# Altium footprint library IC_SMD_BGA.PCBLIB: 101 footprints (part 6 of 13)
Each footprint in its own frame and in the unit in brackets; x right, y up, seen from the top. Pads: shape width x height; smd on the part's side, far side on the other; paste and mask are expansions set on the pad; w line width, h text height; cw(c..) or ccw(c..) is an arc to the next point about the centre after c.
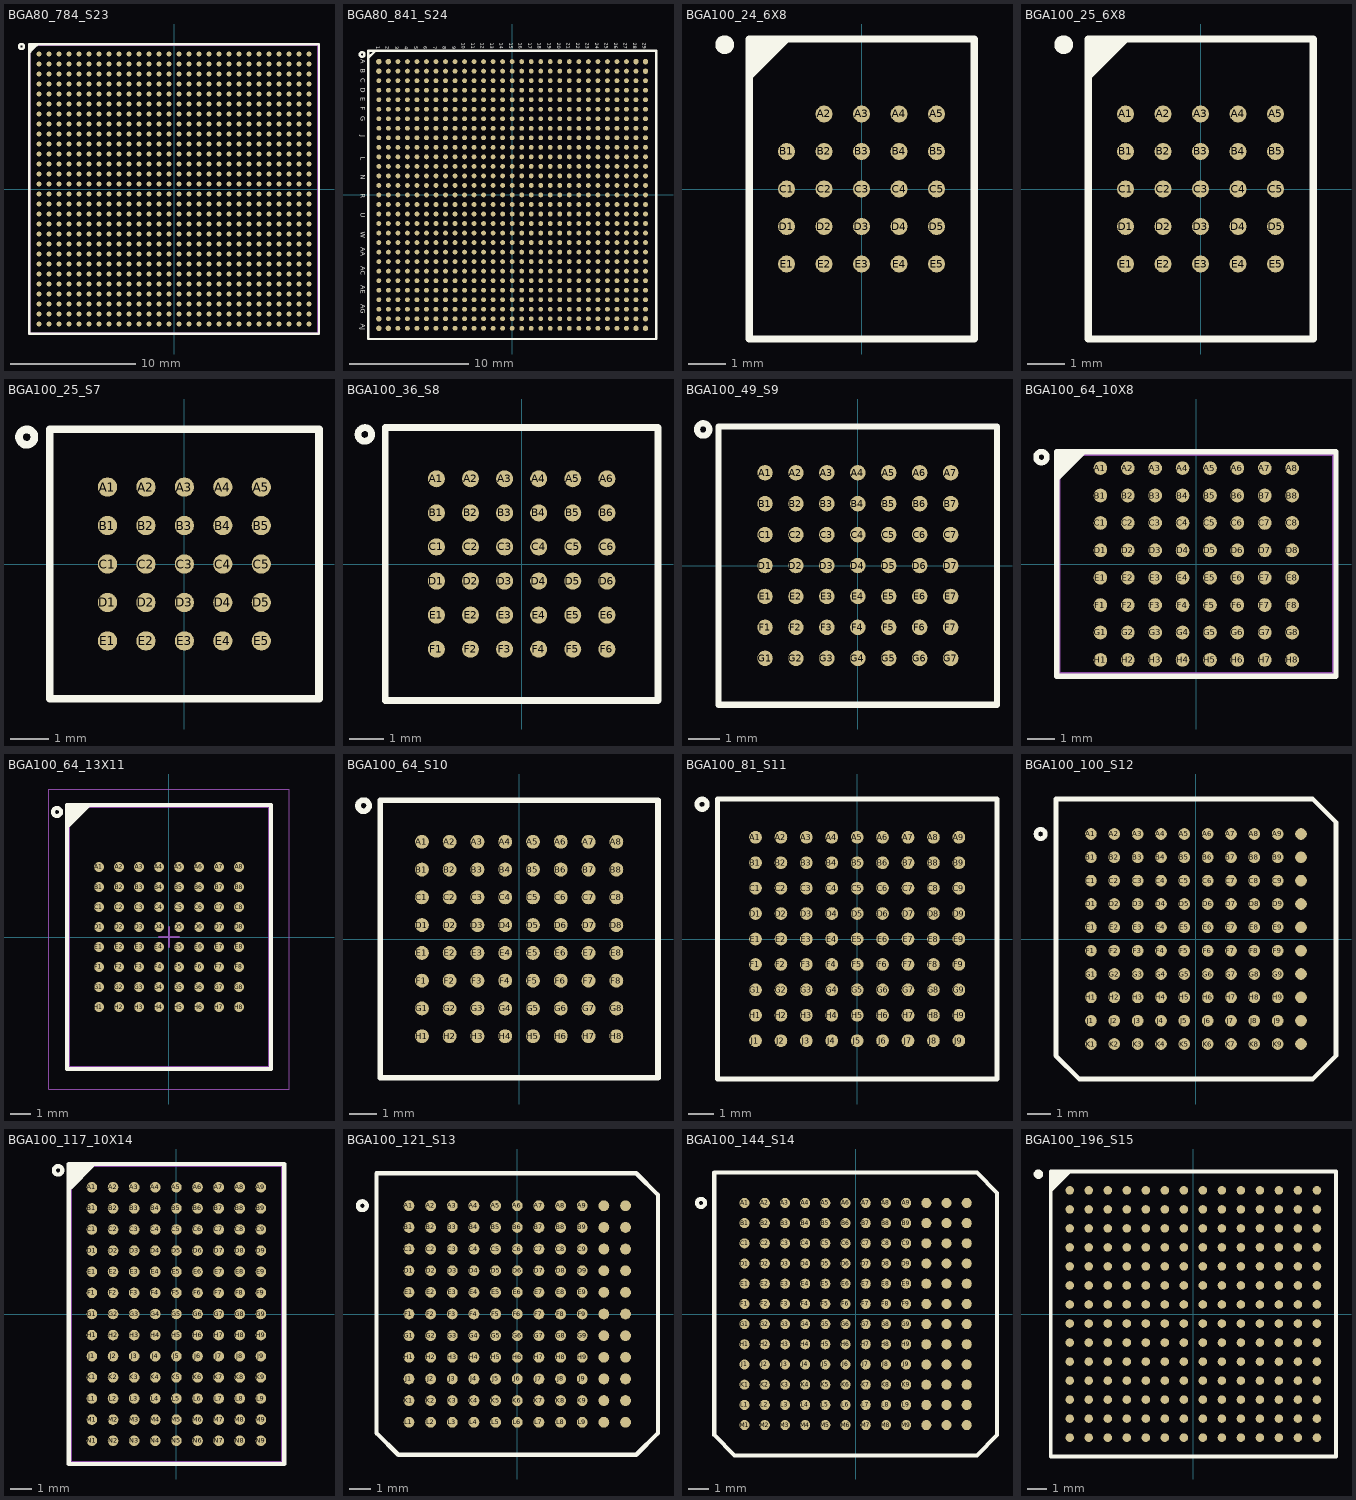
[diagram p5: the footprints below, top view; thin cyan lines are the x and y axes]

## BGA80_784_S23 [mm] "BGA, 784-Leads, SFVC784, Pitch 0.80mm, Body 23.00x23.00mmx3.30mm"
height 3.3
pads (784):
  round 0.4 smd mask+0.05: A1(-10.8,10.8) A2(-10,10.8) A3(-9.2,10.8) A4(-8.4,10.8) A5(-7.6,10.8) A6(-6.8,10.8) A7(-6,10.8) A8(-5.2,10.8) A9(-4.4,10.8) A10(-3.6,10.8) A11(-2.8,10.8) A12(-2,10.8) A13(-1.2,10.8) A14(-0.4,10.8) A15(0.4,10.8) A16(1.2,10.8) A17(2,10.8) A18(2.8,10.8) A19(3.6,10.8) A20(4.4,10.8) A21(5.2,10.8) A22(6,10.8) A23(6.8,10.8) A24(7.6,10.8) A25(8.4,10.8) A26(9.2,10.8) A27(10,10.8) A28(10.8,10.8) AA1(-10.8,-5.2) AA2(-10,-5.2) AA3(-9.2,-5.2) AA4(-8.4,-5.2) AA5(-7.6,-5.2) AA6(-6.8,-5.2) AA7(-6,-5.2) AA8(-5.2,-5.2) AA9(-4.4,-5.2) AA10(-3.6,-5.2) AA11(-2.8,-5.2) AA12(-2,-5.2) AA13(-1.2,-5.2) AA14(-0.4,-5.2) AA15(0.4,-5.2) AA16(1.2,-5.2) AA17(2,-5.2) AA18(2.8,-5.2) AA19(3.6,-5.2) AA20(4.4,-5.2) AA21(5.2,-5.2) AA22(6,-5.2) AA23(6.8,-5.2) AA24(7.6,-5.2) AA25(8.4,-5.2) AA26(9.2,-5.2) AA27(10,-5.2) AA28(10.8,-5.2) AB1(-10.8,-6) AB2(-10,-6) AB3(-9.2,-6) AB4(-8.4,-6) AB5(-7.6,-6) AB6(-6.8,-6) AB7(-6,-6) AB8(-5.2,-6) AB9(-4.4,-6) AB10(-3.6,-6) AB11(-2.8,-6) AB12(-2,-6) AB13(-1.2,-6) AB14(-0.4,-6) AB15(0.4,-6) AB16(1.2,-6) AB17(2,-6) AB18(2.8,-6) AB19(3.6,-6) AB20(4.4,-6) AB21(5.2,-6) AB22(6,-6) AB23(6.8,-6) AB24(7.6,-6) AB25(8.4,-6) AB26(9.2,-6) AB27(10,-6) AB28(10.8,-6) AC1(-10.8,-6.8) AC2(-10,-6.8) AC3(-9.2,-6.8) AC4(-8.4,-6.8) AC5(-7.6,-6.8) AC6(-6.8,-6.8) AC7(-6,-6.8) AC8(-5.2,-6.8) AC9(-4.4,-6.8) AC10(-3.6,-6.8) AC11(-2.8,-6.8) AC12(-2,-6.8) AC13(-1.2,-6.8) AC14(-0.4,-6.8) AC15(0.4,-6.8) AC16(1.2,-6.8) AC17(2,-6.8) AC18(2.8,-6.8) AC19(3.6,-6.8) AC20(4.4,-6.8) AC21(5.2,-6.8) AC22(6,-6.8) AC23(6.8,-6.8) AC24(7.6,-6.8) AC25(8.4,-6.8) AC26(9.2,-6.8) AC27(10,-6.8) AC28(10.8,-6.8) AD1(-10.8,-7.6) AD2(-10,-7.6) AD3(-9.2,-7.6) AD4(-8.4,-7.6) AD5(-7.6,-7.6) AD6(-6.8,-7.6) AD7(-6,-7.6) AD8(-5.2,-7.6) AD9(-4.4,-7.6) AD10(-3.6,-7.6) AD11(-2.8,-7.6) AD12(-2,-7.6) AD13(-1.2,-7.6) AD14(-0.4,-7.6) AD15(0.4,-7.6) AD16(1.2,-7.6) AD17(2,-7.6) AD18(2.8,-7.6) AD19(3.6,-7.6) AD20(4.4,-7.6) AD21(5.2,-7.6) AD22(6,-7.6) AD23(6.8,-7.6) AD24(7.6,-7.6) AD25(8.4,-7.6) AD26(9.2,-7.6) AD27(10,-7.6) AD28(10.8,-7.6) AE1(-10.8,-8.4) AE2(-10,-8.4) AE3(-9.2,-8.4) AE4(-8.4,-8.4) AE5(-7.6,-8.4) AE6(-6.8,-8.4) AE7(-6,-8.4) AE8(-5.2,-8.4) AE9(-4.4,-8.4) AE10(-3.6,-8.4) AE11(-2.8,-8.4) AE12(-2,-8.4) AE13(-1.2,-8.4) AE14(-0.4,-8.4) AE15(0.4,-8.4) AE16(1.2,-8.4) AE17(2,-8.4) AE18(2.8,-8.4) AE19(3.6,-8.4) AE20(4.4,-8.4) AE21(5.2,-8.4) AE22(6,-8.4) AE23(6.8,-8.4) AE24(7.6,-8.4) AE25(8.4,-8.4) AE26(9.2,-8.4) AE27(10,-8.4) AE28(10.8,-8.4) AF1(-10.8,-9.2) AF2(-10,-9.2) AF3(-9.2,-9.2) AF4(-8.4,-9.2) AF5(-7.6,-9.2) AF6(-6.8,-9.2) AF7(-6,-9.2) AF8(-5.2,-9.2) AF9(-4.4,-9.2) AF10(-3.6,-9.2) AF11(-2.8,-9.2) AF12(-2,-9.2) AF13(-1.2,-9.2) AF14(-0.4,-9.2) AF15(0.4,-9.2) AF16(1.2,-9.2) AF17(2,-9.2) AF18(2.8,-9.2) AF19(3.6,-9.2) AF20(4.4,-9.2) AF21(5.2,-9.2) AF22(6,-9.2) AF23(6.8,-9.2) AF24(7.6,-9.2) AF25(8.4,-9.2) AF26(9.2,-9.2) AF27(10,-9.2) AF28(10.8,-9.2) AG1(-10.8,-10) AG2(-10,-10) AG3(-9.2,-10) AG4(-8.4,-10) AG5(-7.6,-10) AG6(-6.8,-10) AG7(-6,-10) AG8(-5.2,-10) AG9(-4.4,-10) AG10(-3.6,-10) AG11(-2.8,-10) AG12(-2,-10) AG13(-1.2,-10) AG14(-0.4,-10) AG15(0.4,-10) AG16(1.2,-10) AG17(2,-10) AG18(2.8,-10) AG19(3.6,-10) AG20(4.4,-10) AG21(5.2,-10) AG22(6,-10) AG23(6.8,-10) AG24(7.6,-10) AG25(8.4,-10) AG26(9.2,-10) AG27(10,-10) AG28(10.8,-10) AH1(-10.8,-10.8) AH2(-10,-10.8) AH3(-9.2,-10.8) AH4(-8.4,-10.8) AH5(-7.6,-10.8) AH6(-6.8,-10.8) AH7(-6,-10.8) AH8(-5.2,-10.8) AH9(-4.4,-10.8) AH10(-3.6,-10.8) AH11(-2.8,-10.8) AH12(-2,-10.8) AH13(-1.2,-10.8) AH14(-0.4,-10.8) AH15(0.4,-10.8) AH16(1.2,-10.8) AH17(2,-10.8) AH18(2.8,-10.8) AH19(3.6,-10.8) AH20(4.4,-10.8) AH21(5.2,-10.8) AH22(6,-10.8) AH23(6.8,-10.8) AH24(7.6,-10.8) AH25(8.4,-10.8) AH26(9.2,-10.8) AH27(10,-10.8) AH28(10.8,-10.8) B1(-10.8,10) B2(-10,10) B3(-9.2,10) B4(-8.4,10) B5(-7.6,10) B6(-6.8,10) B7(-6,10) B8(-5.2,10) B9(-4.4,10) B10(-3.6,10) B11(-2.8,10) B12(-2,10) B13(-1.2,10) B14(-0.4,10) B15(0.4,10) B16(1.2,10) B17(2,10) B18(2.8,10) B19(3.6,10) B20(4.4,10) B21(5.2,10) B22(6,10) B23(6.8,10) B24(7.6,10) B25(8.4,10) B26(9.2,10) B27(10,10) B28(10.8,10) C1(-10.8,9.2) C2(-10,9.2) C3(-9.2,9.2) C4(-8.4,9.2) C5(-7.6,9.2) C6(-6.8,9.2) C7(-6,9.2) C8(-5.2,9.2) C9(-4.4,9.2) C10(-3.6,9.2) C11(-2.8,9.2) C12(-2,9.2) C13(-1.2,9.2) C14(-0.4,9.2) C15(0.4,9.2) C16(1.2,9.2) C17(2,9.2) C18(2.8,9.2) C19(3.6,9.2) C20(4.4,9.2) C21(5.2,9.2) C22(6,9.2) C23(6.8,9.2) C24(7.6,9.2) C25(8.4,9.2) C26(9.2,9.2) C27(10,9.2) C28(10.8,9.2) D1(-10.8,8.4) D2(-10,8.4) D3(-9.2,8.4) D4(-8.4,8.4) D5(-7.6,8.4) D6(-6.8,8.4) D7(-6,8.4) D8(-5.2,8.4) D9(-4.4,8.4) D10(-3.6,8.4) D11(-2.8,8.4) D12(-2,8.4) D13(-1.2,8.4) D14(-0.4,8.4) D15(0.4,8.4) D16(1.2,8.4) D17(2,8.4) D18(2.8,8.4) D19(3.6,8.4) D20(4.4,8.4) D21(5.2,8.4) D22(6,8.4) D23(6.8,8.4) D24(7.6,8.4) D25(8.4,8.4) D26(9.2,8.4) D27(10,8.4) D28(10.8,8.4) E1(-10.8,7.6) E2(-10,7.6) E3(-9.2,7.6) E4(-8.4,7.6) E5(-7.6,7.6) E6(-6.8,7.6) E7(-6,7.6) E8(-5.2,7.6) E9(-4.4,7.6) E10(-3.6,7.6) E11(-2.8,7.6) E12(-2,7.6) E13(-1.2,7.6) E14(-0.4,7.6) E15(0.4,7.6) E16(1.2,7.6) E17(2,7.6) E18(2.8,7.6) E19(3.6,7.6) E20(4.4,7.6) E21(5.2,7.6) E22(6,7.6) E23(6.8,7.6) E24(7.6,7.6) E25(8.4,7.6) E26(9.2,7.6) E27(10,7.6) E28(10.8,7.6) F1(-10.8,6.8) F2(-10,6.8) F3(-9.2,6.8) F4(-8.4,6.8) F5(-7.6,6.8) F6(-6.8,6.8) F7(-6,6.8) F8(-5.2,6.8) F9(-4.4,6.8) F10(-3.6,6.8) F11(-2.8,6.8) F12(-2,6.8) F13(-1.2,6.8) F14(-0.4,6.8) F15(0.4,6.8) F16(1.2,6.8) F17(2,6.8) F18(2.8,6.8) F19(3.6,6.8) F20(4.4,6.8) F21(5.2,6.8) F22(6,6.8) F23(6.8,6.8) F24(7.6,6.8) F25(8.4,6.8) F26(9.2,6.8) F27(10,6.8) F28(10.8,6.8) G1(-10.8,6) G2(-10,6) G3(-9.2,6) G4(-8.4,6) G5(-7.6,6) G6(-6.8,6) G7(-6,6) G8(-5.2,6) G9(-4.4,6) G10(-3.6,6) G11(-2.8,6) G12(-2,6) G13(-1.2,6) G14(-0.4,6) G15(0.4,6) G16(1.2,6) G17(2,6) G18(2.8,6) G19(3.6,6) G20(4.4,6) G21(5.2,6) G22(6,6) G23(6.8,6) G24(7.6,6) G25(8.4,6) G26(9.2,6) G27(10,6) G28(10.8,6) H1(-10.8,5.2) H2(-10,5.2) H3(-9.2,5.2) H4(-8.4,5.2) H5(-7.6,5.2) H6(-6.8,5.2) H7(-6,5.2) H8(-5.2,5.2) H9(-4.4,5.2) H10(-3.6,5.2) H11(-2.8,5.2) H12(-2,5.2) H13(-1.2,5.2) H14(-0.4,5.2) H15(0.4,5.2) H16(1.2,5.2) H17(2,5.2) H18(2.8,5.2) H19(3.6,5.2) H20(4.4,5.2) H21(5.2,5.2) H22(6,5.2) H23(6.8,5.2) H24(7.6,5.2) H25(8.4,5.2) H26(9.2,5.2) H27(10,5.2) H28(10.8,5.2) J1(-10.8,4.4) J2(-10,4.4) J3(-9.2,4.4) J4(-8.4,4.4) J5(-7.6,4.4) J6(-6.8,4.4) J7(-6,4.4) J8(-5.2,4.4) J9(-4.4,4.4) J10(-3.6,4.4) J11(-2.8,4.4) J12(-2,4.4) J13(-1.2,4.4) J14(-0.4,4.4) J15(0.4,4.4) J16(1.2,4.4) J17(2,4.4) J18(2.8,4.4) J19(3.6,4.4) J20(4.4,4.4) J21(5.2,4.4) J22(6,4.4) J23(6.8,4.4) J24(7.6,4.4) J25(8.4,4.4) J26(9.2,4.4) J27(10,4.4) J28(10.8,4.4) K1(-10.8,3.6) K2(-10,3.6) K3(-9.2,3.6) K4(-8.4,3.6) K5(-7.6,3.6) K6(-6.8,3.6) K7(-6,3.6) K8(-5.2,3.6) K9(-4.4,3.6) K10(-3.6,3.6) K11(-2.8,3.6) K12(-2,3.6) K13(-1.2,3.6) K14(-0.4,3.6) K15(0.4,3.6) K16(1.2,3.6) K17(2,3.6) K18(2.8,3.6) K19(3.6,3.6) K20(4.4,3.6) K21(5.2,3.6) K22(6,3.6) K23(6.8,3.6) K24(7.6,3.6) K25(8.4,3.6) K26(9.2,3.6) K27(10,3.6) K28(10.8,3.6) L1(-10.8,2.8) L2(-10,2.8) L3(-9.2,2.8) L4(-8.4,2.8) L5(-7.6,2.8) L6(-6.8,2.8) L7(-6,2.8) L8(-5.2,2.8) L9(-4.4,2.8) L10(-3.6,2.8) L11(-2.8,2.8) L12(-2,2.8) L13(-1.2,2.8) L14(-0.4,2.8) L15(0.4,2.8) L16(1.2,2.8) L17(2,2.8) L18(2.8,2.8) L19(3.6,2.8) L20(4.4,2.8) L21(5.2,2.8) L22(6,2.8) L23(6.8,2.8) L24(7.6,2.8) L25(8.4,2.8) L26(9.2,2.8) L27(10,2.8) L28(10.8,2.8) M1(-10.8,2) M2(-10,2) M3(-9.2,2) M4(-8.4,2) M5(-7.6,2) M6(-6.8,2) M7(-6,2) M8(-5.2,2) M9(-4.4,2) M10(-3.6,2) M11(-2.8,2) M12(-2,2) M13(-1.2,2) M14(-0.4,2) M15(0.4,2) M16(1.2,2) M17(2,2) M18(2.8,2) M19(3.6,2) M20(4.4,2) M21(5.2,2) M22(6,2) M23(6.8,2) M24(7.6,2) M25(8.4,2) M26(9.2,2) M27(10,2) M28(10.8,2) N1(-10.8,1.2) N2(-10,1.2) N3(-9.2,1.2) N4(-8.4,1.2) N5(-7.6,1.2) N6(-6.8,1.2) N7(-6,1.2) N8(-5.2,1.2) N9(-4.4,1.2) N10(-3.6,1.2) N11(-2.8,1.2) N12(-2,1.2) N13(-1.2,1.2) N14(-0.4,1.2) N15(0.4,1.2) N16(1.2,1.2) N17(2,1.2) N18(2.8,1.2) N19(3.6,1.2) N20(4.4,1.2) N21(5.2,1.2) N22(6,1.2) N23(6.8,1.2) N24(7.6,1.2) N25(8.4,1.2) N26(9.2,1.2) N27(10,1.2) N28(10.8,1.2) P1(-10.8,0.4) P2(-10,0.4) P3(-9.2,0.4) P4(-8.4,0.4) P5(-7.6,0.4) P6(-6.8,0.4) P7(-6,0.4) P8(-5.2,0.4) P9(-4.4,0.4) P10(-3.6,0.4) P11(-2.8,0.4) P12(-2,0.4) P13(-1.2,0.4) P14(-0.4,0.4) P15(0.4,0.4) P16(1.2,0.4) P17(2,0.4) P18(2.8,0.4) P19(3.6,0.4) P20(4.4,0.4) P21(5.2,0.4) P22(6,0.4) P23(6.8,0.4) P24(7.6,0.4) P25(8.4,0.4) P26(9.2,0.4) P27(10,0.4) P28(10.8,0.4) R1(-10.8,-0.4) R2(-10,-0.4) R3(-9.2,-0.4) R4(-8.4,-0.4) R5(-7.6,-0.4) R6(-6.8,-0.4) R7(-6,-0.4) R8(-5.2,-0.4) R9(-4.4,-0.4) R10(-3.6,-0.4) R11(-2.8,-0.4) R12(-2,-0.4) R13(-1.2,-0.4) R14(-0.4,-0.4) R15(0.4,-0.4) R16(1.2,-0.4) R17(2,-0.4) R18(2.8,-0.4) R19(3.6,-0.4) R20(4.4,-0.4) R21(5.2,-0.4) R22(6,-0.4) R23(6.8,-0.4) R24(7.6,-0.4) R25(8.4,-0.4) R26(9.2,-0.4) R27(10,-0.4) R28(10.8,-0.4) T1(-10.8,-1.2) T2(-10,-1.2) T3(-9.2,-1.2) T4(-8.4,-1.2) T5(-7.6,-1.2) T6(-6.8,-1.2) T7(-6,-1.2) T8(-5.2,-1.2) T9(-4.4,-1.2) T10(-3.6,-1.2) T11(-2.8,-1.2) T12(-2,-1.2) T13(-1.2,-1.2) T14(-0.4,-1.2) T15(0.4,-1.2) T16(1.2,-1.2) T17(2,-1.2) T18(2.8,-1.2) T19(3.6,-1.2) T20(4.4,-1.2) T21(5.2,-1.2) T22(6,-1.2) T23(6.8,-1.2) T24(7.6,-1.2) T25(8.4,-1.2) T26(9.2,-1.2) T27(10,-1.2) T28(10.8,-1.2) U1(-10.8,-2) U2(-10,-2) U3(-9.2,-2) U4(-8.4,-2) U5(-7.6,-2) U6(-6.8,-2) U7(-6,-2) U8(-5.2,-2) U9(-4.4,-2) U10(-3.6,-2) U11(-2.8,-2) U12(-2,-2) U13(-1.2,-2) U14(-0.4,-2) U15(0.4,-2) U16(1.2,-2) U17(2,-2) U18(2.8,-2) U19(3.6,-2) U20(4.4,-2) U21(5.2,-2) U22(6,-2) U23(6.8,-2) U24(7.6,-2) U25(8.4,-2) U26(9.2,-2) U27(10,-2) U28(10.8,-2) V1(-10.8,-2.8) V2(-10,-2.8) V3(-9.2,-2.8) V4(-8.4,-2.8) V5(-7.6,-2.8) V6(-6.8,-2.8) V7(-6,-2.8) V8(-5.2,-2.8) V9(-4.4,-2.8) V10(-3.6,-2.8) V11(-2.8,-2.8) V12(-2,-2.8) V13(-1.2,-2.8) V14(-0.4,-2.8) V15(0.4,-2.8) V16(1.2,-2.8) V17(2,-2.8) V18(2.8,-2.8) V19(3.6,-2.8) V20(4.4,-2.8) V21(5.2,-2.8) V22(6,-2.8) V23(6.8,-2.8) V24(7.6,-2.8) V25(8.4,-2.8) V26(9.2,-2.8) V27(10,-2.8) V28(10.8,-2.8) W1(-10.8,-3.6) W2(-10,-3.6) W3(-9.2,-3.6) W4(-8.4,-3.6) W5(-7.6,-3.6) W6(-6.8,-3.6) W7(-6,-3.6) W8(-5.2,-3.6) W9(-4.4,-3.6) W10(-3.6,-3.6) W11(-2.8,-3.6) W12(-2,-3.6) W13(-1.2,-3.6) W14(-0.4,-3.6) W15(0.4,-3.6) W16(1.2,-3.6) W17(2,-3.6) W18(2.8,-3.6) W19(3.6,-3.6) W20(4.4,-3.6) W21(5.2,-3.6) W22(6,-3.6) W23(6.8,-3.6) W24(7.6,-3.6) W25(8.4,-3.6) W26(9.2,-3.6) W27(10,-3.6) W28(10.8,-3.6) Y1(-10.8,-4.4) Y2(-10,-4.4) Y3(-9.2,-4.4) Y4(-8.4,-4.4) Y5(-7.6,-4.4) Y6(-6.8,-4.4) Y7(-6,-4.4) Y8(-5.2,-4.4) Y9(-4.4,-4.4) Y10(-3.6,-4.4) Y11(-2.8,-4.4) Y12(-2,-4.4) Y13(-1.2,-4.4) Y14(-0.4,-4.4) Y15(0.4,-4.4) Y16(1.2,-4.4) Y17(2,-4.4) Y18(2.8,-4.4) Y19(3.6,-4.4) Y20(4.4,-4.4) Y21(5.2,-4.4) Y22(6,-4.4) Y23(6.8,-4.4) Y24(7.6,-4.4) Y25(8.4,-4.4) Y26(9.2,-4.4) Y27(10,-4.4) Y28(10.8,-4.4)
TopOverlay:
  circle w0.2: c-12.2,11.4 r0.2
  region: -10.984,11.5 -11.5,10.984 -11.5,11.5
  lines w0.2: -11.5,10.984 -10.984,11.5 ; -11.6,-11.6 11.6,-11.6 11.6,11.6 -11.6,11.6 -11.6,-11.6
Mechanical13:
  lines w0.1: -11.5,-11.5 11.5,-11.5 11.5,11.5 -11.5,11.5 -11.5,-11.5
3D body "BGA80_784_23X23.step": height 3.3, standoff 0, extent -11.5,-11.5 11.5,11.5

## BGA80_841_S24 [mil] "BGA_841P_31_945X945"
pads (841):
  round 18 smd: A1(-440.94,440.94) A2(-409.45,440.94) A28(409.45,440.94) A29(440.94,440.94) AH1(-440.94,-409.45) AH29(440.94,-409.45) AJ1(-440.94,-440.94) AJ2(-409.45,-440.94) AJ28(409.45,-440.94) AJ29(440.94,-440.94) B1(-440.94,409.45) B29(440.94,409.45)
  round 16 smd: A3(-377.95,440.94) A4(-346.46,440.94) A5(-314.96,440.94) A6(-283.46,440.94) A7(-251.97,440.94) A8(-220.47,440.94) A9(-188.98,440.94) A10(-157.48,440.94) A11(-125.98,440.94) A12(-94.49,440.94) A13(-62.99,440.94) A14(-31.5,440.94) A15(0,440.94) A16(31.5,440.94) A17(62.99,440.94) A18(94.49,440.94) A19(125.98,440.94) A20(157.48,440.94) A21(188.98,440.94) A22(220.47,440.94) A23(251.97,440.94) A24(283.46,440.94) A25(314.96,440.94) A26(346.46,440.94) A27(377.95,440.94) AA1(-440.94,-188.98) AA2(-409.45,-188.98) AA3(-377.95,-188.98) AA4(-346.46,-188.98) AA5(-314.96,-188.98) AA6(-283.46,-188.98) AA7(-251.97,-188.98) AA8(-220.47,-188.98) AA9(-188.98,-188.98) AA10(-157.48,-188.98) AA11(-125.98,-188.98) AA12(-94.49,-188.98) AA13(-62.99,-188.98) AA14(-31.5,-188.98) AA15(0,-188.98) AA16(31.5,-188.98) AA17(62.99,-188.98) AA18(94.49,-188.98) AA19(125.98,-188.98) AA20(157.48,-188.98) AA21(188.98,-188.98) AA22(220.47,-188.98) AA23(251.97,-188.98) AA24(283.46,-188.98) AA25(314.96,-188.98) AA26(346.46,-188.98) AA27(377.95,-188.98) AA28(409.45,-188.98) AA29(440.94,-188.98) AB1(-440.94,-220.47) AB2(-409.45,-220.47) AB3(-377.95,-220.47) AB4(-346.46,-220.47) AB5(-314.96,-220.47) AB6(-283.46,-220.47) AB7(-251.97,-220.47) AB8(-220.47,-220.47) AB9(-188.98,-220.47) AB10(-157.48,-220.47) AB11(-125.98,-220.47) AB12(-94.49,-220.47) AB13(-62.99,-220.47) AB14(-31.5,-220.47) AB15(0,-220.47) AB16(31.5,-220.47) AB17(62.99,-220.47) AB18(94.49,-220.47) AB19(125.98,-220.47) AB20(157.48,-220.47) AB21(188.98,-220.47) AB22(220.47,-220.47) AB23(251.97,-220.47) AB24(283.46,-220.47) AB25(314.96,-220.47) AB26(346.46,-220.47) AB27(377.95,-220.47) AB28(409.45,-220.47) AB29(440.94,-220.47) AC1(-440.94,-251.97) AC2(-409.45,-251.97) AC3(-377.95,-251.97) AC4(-346.46,-251.97) AC5(-314.96,-251.97) AC6(-283.46,-251.97) AC7(-251.97,-251.97) AC8(-220.47,-251.97) AC9(-188.98,-251.97) AC10(-157.48,-251.97) AC11(-125.98,-251.97) AC12(-94.49,-251.97) AC13(-62.99,-251.97) AC14(-31.5,-251.97) AC15(0,-251.97) AC16(31.5,-251.97) AC17(62.99,-251.97) AC18(94.49,-251.97) AC19(125.98,-251.97) AC20(157.48,-251.97) AC21(188.98,-251.97) AC22(220.47,-251.97) AC23(251.97,-251.97) AC24(283.46,-251.97) AC25(314.96,-251.97) AC26(346.46,-251.97) AC27(377.95,-251.97) AC28(409.45,-251.97) AC29(440.94,-251.97) AD1(-440.94,-283.46) AD2(-409.45,-283.46) AD3(-377.95,-283.46) AD4(-346.46,-283.46) AD5(-314.96,-283.46) AD6(-283.46,-283.46) AD7(-251.97,-283.46) AD8(-220.47,-283.46) AD9(-188.98,-283.46) AD10(-157.48,-283.46) AD11(-125.98,-283.46) AD12(-94.49,-283.46) AD13(-62.99,-283.46) AD14(-31.5,-283.46) AD15(0,-283.46) AD16(31.5,-283.46) AD17(62.99,-283.46) AD18(94.49,-283.46) AD19(125.98,-283.46) AD20(157.48,-283.46) AD21(188.98,-283.46) AD22(220.47,-283.46) AD23(251.97,-283.46) AD24(283.46,-283.46) AD25(314.96,-283.46) AD26(346.46,-283.46) AD27(377.95,-283.46) AD28(409.45,-283.46) AD29(440.94,-283.46) AE1(-440.94,-314.96) AE2(-409.45,-314.96) AE3(-377.95,-314.96) AE4(-346.46,-314.96) AE5(-314.96,-314.96) AE6(-283.46,-314.96) AE7(-251.97,-314.96) AE8(-220.47,-314.96) AE9(-188.98,-314.96) AE10(-157.48,-314.96) AE11(-125.98,-314.96) AE12(-94.49,-314.96) AE13(-62.99,-314.96) AE14(-31.5,-314.96) AE15(0,-314.96) AE16(31.5,-314.96) AE17(62.99,-314.96) AE18(94.49,-314.96) AE19(125.98,-314.96) AE20(157.48,-314.96) AE21(188.98,-314.96) AE22(220.47,-314.96) AE23(251.97,-314.96) AE24(283.46,-314.96) AE25(314.96,-314.96) AE26(346.46,-314.96) AE27(377.95,-314.96) AE28(409.45,-314.96) AE29(440.94,-314.96) AF1(-440.94,-346.46) AF2(-409.45,-346.46) AF3(-377.95,-346.46) AF4(-346.46,-346.46) AF5(-314.96,-346.46) AF6(-283.46,-346.46) AF7(-251.97,-346.46) AF8(-220.47,-346.46) AF9(-188.98,-346.46) AF10(-157.48,-346.46) AF11(-125.98,-346.46) AF12(-94.49,-346.46) AF13(-62.99,-346.46) AF14(-31.5,-346.46) AF15(0,-346.46) AF16(31.5,-346.46) AF17(62.99,-346.46) AF18(94.49,-346.46) AF19(125.98,-346.46) AF20(157.48,-346.46) AF21(188.98,-346.46) AF22(220.47,-346.46) AF23(251.97,-346.46) AF24(283.46,-346.46) AF25(314.96,-346.46) AF26(346.46,-346.46) AF27(377.95,-346.46) AF28(409.45,-346.46) AF29(440.94,-346.46) AG1(-440.94,-377.95) AG2(-409.45,-377.95) AG3(-377.95,-377.95) AG4(-346.46,-377.95) AG5(-314.96,-377.95) AG6(-283.46,-377.95) AG7(-251.97,-377.95) AG8(-220.47,-377.95) AG9(-188.98,-377.95) AG10(-157.48,-377.95) AG11(-125.98,-377.95) AG12(-94.49,-377.95) AG13(-62.99,-377.95) AG14(-31.5,-377.95) AG15(0,-377.95) AG16(31.5,-377.95) AG17(62.99,-377.95) AG18(94.49,-377.95) AG19(125.98,-377.95) AG20(157.48,-377.95) AG21(188.98,-377.95) AG22(220.47,-377.95) AG23(251.97,-377.95) AG24(283.46,-377.95) AG25(314.96,-377.95) AG26(346.46,-377.95) AG27(377.95,-377.95) AG28(409.45,-377.95) AG29(440.94,-377.95) AH2(-409.45,-409.45) AH3(-377.95,-409.45) AH4(-346.46,-409.45) AH5(-314.96,-409.45) AH6(-283.46,-409.45) AH7(-251.97,-409.45) AH8(-220.47,-409.45) AH9(-188.98,-409.45) AH10(-157.48,-409.45) AH11(-125.98,-409.45) AH12(-94.49,-409.45) AH13(-62.99,-409.45) AH14(-31.5,-409.45) AH15(0,-409.45) AH16(31.5,-409.45) AH17(62.99,-409.45) AH18(94.49,-409.45) AH19(125.98,-409.45) AH20(157.48,-409.45) AH21(188.98,-409.45) AH22(220.47,-409.45) AH23(251.97,-409.45) AH24(283.46,-409.45) AH25(314.96,-409.45) AH26(346.46,-409.45) AH27(377.95,-409.45) AH28(409.45,-409.45) AJ3(-377.95,-440.94) AJ4(-346.46,-440.94) AJ5(-314.96,-440.94) AJ6(-283.46,-440.94) AJ7(-251.97,-440.94) AJ8(-220.47,-440.94) AJ9(-188.98,-440.94) AJ10(-157.48,-440.94) AJ11(-125.98,-440.94) AJ12(-94.49,-440.94) AJ13(-62.99,-440.94) AJ14(-31.5,-440.94) AJ15(0,-440.94) AJ16(31.5,-440.94) AJ17(62.99,-440.94) AJ18(94.49,-440.94) AJ19(125.98,-440.94) AJ20(157.48,-440.94) AJ21(188.98,-440.94) AJ22(220.47,-440.94) AJ23(251.97,-440.94) AJ24(283.46,-440.94) AJ25(314.96,-440.94) AJ26(346.46,-440.94) AJ27(377.95,-440.94) B2(-409.45,409.45) B3(-377.95,409.45) B4(-346.46,409.45) B5(-314.96,409.45) B6(-283.46,409.45) B7(-251.97,409.45) B8(-220.47,409.45) B9(-188.98,409.45) B10(-157.48,409.45) B11(-125.98,409.45) B12(-94.49,409.45) B13(-62.99,409.45) B14(-31.5,409.45) B15(0,409.45) B16(31.5,409.45) B17(62.99,409.45) B18(94.49,409.45) B19(125.98,409.45) B20(157.48,409.45) B21(188.98,409.45) B22(220.47,409.45) B23(251.97,409.45) B24(283.46,409.45) B25(314.96,409.45) B26(346.46,409.45) B27(377.95,409.45) B28(409.45,409.45) C1(-440.94,377.95) C2(-409.45,377.95) C3(-377.95,377.95) C4(-346.46,377.95) C5(-314.96,377.95) C6(-283.46,377.95) C7(-251.97,377.95) C8(-220.47,377.95) C9(-188.98,377.95) C10(-157.48,377.95) C11(-125.98,377.95) C12(-94.49,377.95) C13(-62.99,377.95) C14(-31.5,377.95) C15(0,377.95) C16(31.5,377.95) C17(62.99,377.95) C18(94.49,377.95) C19(125.98,377.95) C20(157.48,377.95) C21(188.98,377.95) C22(220.47,377.95) C23(251.97,377.95) C24(283.46,377.95) C25(314.96,377.95) C26(346.46,377.95) C27(377.95,377.95) C28(409.45,377.95) C29(440.94,377.95) D1(-440.94,346.46) D2(-409.45,346.46) D3(-377.95,346.46) D4(-346.46,346.46) D5(-314.96,346.46) D6(-283.46,346.46) D7(-251.97,346.46) D8(-220.47,346.46) D9(-188.98,346.46) D10(-157.48,346.46) D11(-125.98,346.46) D12(-94.49,346.46) D13(-62.99,346.46) D14(-31.5,346.46) D15(0,346.46) D16(31.5,346.46) D17(62.99,346.46) D18(94.49,346.46) D19(125.98,346.46) D20(157.48,346.46) D21(188.98,346.46) D22(220.47,346.46) D23(251.97,346.46) D24(283.46,346.46) D25(314.96,346.46) D26(346.46,346.46) D27(377.95,346.46) D28(409.45,346.46) D29(440.94,346.46) E1(-440.94,314.96) E2(-409.45,314.96) E3(-377.95,314.96) E4(-346.46,314.96) E5(-314.96,314.96) E6(-283.46,314.96) E7(-251.97,314.96) E8(-220.47,314.96) E9(-188.98,314.96) E10(-157.48,314.96) E11(-125.98,314.96) E12(-94.49,314.96) E13(-62.99,314.96) E14(-31.5,314.96) E15(0,314.96) E16(31.5,314.96) E17(62.99,314.96) E18(94.49,314.96) E19(125.98,314.96) E20(157.48,314.96) E21(188.98,314.96) E22(220.47,314.96) E23(251.97,314.96) E24(283.46,314.96) E25(314.96,314.96) E26(346.46,314.96) E27(377.95,314.96) E28(409.45,314.96) E29(440.94,314.96) F1(-440.94,283.46) F2(-409.45,283.46) F3(-377.95,283.46) F4(-346.46,283.46) F5(-314.96,283.46) F6(-283.46,283.46) F7(-251.97,283.46) F8(-220.47,283.46) F9(-188.98,283.46) F10(-157.48,283.46) F11(-125.98,283.46) F12(-94.49,283.46) F13(-62.99,283.46) F14(-31.5,283.46) F15(0,283.46) F16(31.5,283.46) F17(62.99,283.46) F18(94.49,283.46) F19(125.98,283.46) F20(157.48,283.46) F21(188.98,283.46) F22(220.47,283.46) F23(251.97,283.46) F24(283.46,283.46) F25(314.96,283.46) F26(346.46,283.46) F27(377.95,283.46) F28(409.45,283.46) F29(440.94,283.46) G1(-440.94,251.97) G2(-409.45,251.97) G3(-377.95,251.97) G4(-346.46,251.97) G5(-314.96,251.97) G6(-283.46,251.97) G7(-251.97,251.97) G8(-220.47,251.97) G9(-188.98,251.97) G10(-157.48,251.97) G11(-125.98,251.97) G12(-94.49,251.97) G13(-62.99,251.97) G14(-31.5,251.97) G15(0,251.97) G16(31.5,251.97) G17(62.99,251.97) G18(94.49,251.97) G19(125.98,251.97) G20(157.48,251.97) G21(188.98,251.97) G22(220.47,251.97) G23(251.97,251.97) G24(283.46,251.97) G25(314.96,251.97) G26(346.46,251.97) G27(377.95,251.97) G28(409.45,251.97) G29(440.94,251.97) H1(-440.94,220.47) H2(-409.45,220.47) H3(-377.95,220.47) H4(-346.46,220.47) H5(-314.96,220.47) H6(-283.46,220.47) H7(-251.97,220.47) H8(-220.47,220.47) H9(-188.98,220.47) H10(-157.48,220.47) H11(-125.98,220.47) H12(-94.49,220.47) H13(-62.99,220.47) H14(-31.5,220.47) H15(0,220.47) H16(31.5,220.47) H17(62.99,220.47) H18(94.49,220.47) H19(125.98,220.47) H20(157.48,220.47) H21(188.98,220.47) H22(220.47,220.47) H23(251.97,220.47) H24(283.46,220.47) H25(314.96,220.47) H26(346.46,220.47) H27(377.95,220.47) H28(409.45,220.47) H29(440.94,220.47) J1(-440.94,188.98) J2(-409.45,188.98) J3(-377.95,188.98) J4(-346.46,188.98) J5(-314.96,188.98) J6(-283.46,188.98) J7(-251.97,188.98) J8(-220.47,188.98) J9(-188.98,188.98) J10(-157.48,188.98) J11(-125.98,188.98) J12(-94.49,188.98) J13(-62.99,188.98) J14(-31.5,188.98) J15(0,188.98) J16(31.5,188.98) J17(62.99,188.98) J18(94.49,188.98) J19(125.98,188.98) J20(157.48,188.98) J21(188.98,188.98) J22(220.47,188.98) J23(251.97,188.98) J24(283.46,188.98) J25(314.96,188.98) J26(346.46,188.98) J27(377.95,188.98) J28(409.45,188.98) J29(440.94,188.98) K1(-440.94,157.48) K2(-409.45,157.48) K3(-377.95,157.48) K4(-346.46,157.48) K5(-314.96,157.48) K6(-283.46,157.48) K7(-251.97,157.48) K8(-220.47,157.48) K9(-188.98,157.48) K10(-157.48,157.48) K11(-125.98,157.48) K12(-94.49,157.48) K13(-62.99,157.48) K14(-31.5,157.48) K15(0,157.48) K16(31.5,157.48) K17(62.99,157.48) K18(94.49,157.48) K19(125.98,157.48) K20(157.48,157.48) K21(188.98,157.48) K22(220.47,157.48) K23(251.97,157.48) K24(283.46,157.48) K25(314.96,157.48) K26(346.46,157.48) K27(377.95,157.48) K28(409.45,157.48) K29(440.94,157.48) L1(-440.94,125.98) L2(-409.45,125.98) L3(-377.95,125.98) L4(-346.46,125.98) L5(-314.96,125.98) L6(-283.46,125.98) L7(-251.97,125.98) L8(-220.47,125.98) L9(-188.98,125.98) L10(-157.48,125.98) L11(-125.98,125.98) L12(-94.49,125.98) L13(-62.99,125.98) L14(-31.5,125.98) L15(0,125.98) L16(31.5,125.98) L17(62.99,125.98) L18(94.49,125.98) L19(125.98,125.98) L20(157.48,125.98) L21(188.98,125.98) L22(220.47,125.98) L23(251.97,125.98) L24(283.46,125.98) L25(314.96,125.98) L26(346.46,125.98) L27(377.95,125.98) L28(409.45,125.98) L29(440.94,125.98) M1(-440.94,94.49) M2(-409.45,94.49) M3(-377.95,94.49) M4(-346.46,94.49) M5(-314.96,94.49) M6(-283.46,94.49) M7(-251.97,94.49) M8(-220.47,94.49) M9(-188.98,94.49) M10(-157.48,94.49) M11(-125.98,94.49) M12(-94.49,94.49) M13(-62.99,94.49) M14(-31.5,94.49) M15(0,94.49) M16(31.5,94.49) M17(62.99,94.49) M18(94.49,94.49) M19(125.98,94.49) M20(157.48,94.49) M21(188.98,94.49) M22(220.47,94.49) M23(251.97,94.49) M24(283.46,94.49) M25(314.96,94.49) M26(346.46,94.49) M27(377.95,94.49) M28(409.45,94.49) M29(440.94,94.49) N1(-440.94,62.99) N2(-409.45,62.99) N3(-377.95,62.99) N4(-346.46,62.99) N5(-314.96,62.99) N6(-283.46,62.99) N7(-251.97,62.99) N8(-220.47,62.99) N9(-188.98,62.99) N10(-157.48,62.99) N11(-125.98,62.99) N12(-94.49,62.99) N13(-62.99,62.99) N14(-31.5,62.99) N15(0,62.99) N16(31.5,62.99) N17(62.99,62.99) N18(94.49,62.99) N19(125.98,62.99) N20(157.48,62.99) N21(188.98,62.99) N22(220.47,62.99) N23(251.97,62.99) N24(283.46,62.99) N25(314.96,62.99) N26(346.46,62.99) N27(377.95,62.99) N28(409.45,62.99) N29(440.94,62.99) P1(-440.94,31.5) P2(-409.45,31.5) P3(-377.95,31.5) P4(-346.46,31.5) P5(-314.96,31.5) P6(-283.46,31.5) P7(-251.97,31.5) P8(-220.47,31.5) P9(-188.98,31.5) P10(-157.48,31.5) P11(-125.98,31.5) P12(-94.49,31.5) P13(-62.99,31.5) P14(-31.5,31.5) P15(0,31.5) P16(31.5,31.5) P17(62.99,31.5) P18(94.49,31.5) P19(125.98,31.5) P20(157.48,31.5) P21(188.98,31.5) P22(220.47,31.5) P23(251.97,31.5) P24(283.46,31.5) P25(314.96,31.5) P26(346.46,31.5) P27(377.95,31.5) P28(409.45,31.5) P29(440.94,31.5) R1(-440.94,0) R2(-409.45,0) R3(-377.95,0) R4(-346.46,0) R5(-314.96,0) R6(-283.46,0) R7(-251.97,0) R8(-220.47,0) R9(-188.98,0) R10(-157.48,0) R11(-125.98,0) R12(-94.49,0) R13(-62.99,0) R14(-31.5,0) R15(0,0) R16(31.5,0) R17(62.99,0) R18(94.49,0) R19(125.98,0) R20(157.48,0) R21(188.98,0) R22(220.47,0) R23(251.97,0) R24(283.46,0) R25(314.96,0) R26(346.46,0) R27(377.95,0) R28(409.45,0) R29(440.94,0) T1(-440.94,-31.5) T2(-409.45,-31.5) T3(-377.95,-31.5) T4(-346.46,-31.5) T5(-314.96,-31.5) T6(-283.46,-31.5) T7(-251.97,-31.5) T8(-220.47,-31.5) T9(-188.98,-31.5) T10(-157.48,-31.5) T11(-125.98,-31.5) T12(-94.49,-31.5) T13(-62.99,-31.5) T14(-31.5,-31.5) T15(0,-31.5) T16(31.5,-31.5) T17(62.99,-31.5) T18(94.49,-31.5) T19(125.98,-31.5) T20(157.48,-31.5) T21(188.98,-31.5) T22(220.47,-31.5) T23(251.97,-31.5) T24(283.46,-31.5) T25(314.96,-31.5) T26(346.46,-31.5) T27(377.95,-31.5) T28(409.45,-31.5) T29(440.94,-31.5) U1(-440.94,-62.99) U2(-409.45,-62.99) U3(-377.95,-62.99) U4(-346.46,-62.99) U5(-314.96,-62.99) U6(-283.46,-62.99) U7(-251.97,-62.99) U8(-220.47,-62.99) U9(-188.98,-62.99) U10(-157.48,-62.99) U11(-125.98,-62.99) U12(-94.49,-62.99) U13(-62.99,-62.99) U14(-31.5,-62.99) U15(0,-62.99) U16(31.5,-62.99) U17(62.99,-62.99) U18(94.49,-62.99) U19(125.98,-62.99) U20(157.48,-62.99) U21(188.98,-62.99) U22(220.47,-62.99) U23(251.97,-62.99) U24(283.46,-62.99) U25(314.96,-62.99) U26(346.46,-62.99) U27(377.95,-62.99) U28(409.45,-62.99) U29(440.94,-62.99) V1(-440.94,-94.49) V2(-409.45,-94.49) V3(-377.95,-94.49) V4(-346.46,-94.49) V5(-314.96,-94.49) V6(-283.46,-94.49) V7(-251.97,-94.49) V8(-220.47,-94.49) V9(-188.98,-94.49) V10(-157.48,-94.49) V11(-125.98,-94.49) V12(-94.49,-94.49) V13(-62.99,-94.49) V14(-31.5,-94.49) V15(0,-94.49) V16(31.5,-94.49) V17(62.99,-94.49) V18(94.49,-94.49) V19(125.98,-94.49) V20(157.48,-94.49) V21(188.98,-94.49) V22(220.47,-94.49) V23(251.97,-94.49) V24(283.46,-94.49) V25(314.96,-94.49) V26(346.46,-94.49) V27(377.95,-94.49) V28(409.45,-94.49) V29(440.94,-94.49) W1(-440.94,-125.98) W2(-409.45,-125.98) W3(-377.95,-125.98) W4(-346.46,-125.98) W5(-314.96,-125.98) W6(-283.46,-125.98) W7(-251.97,-125.98) W8(-220.47,-125.98) W9(-188.98,-125.98) W10(-157.48,-125.98) W11(-125.98,-125.98) W12(-94.49,-125.98) W13(-62.99,-125.98) W14(-31.5,-125.98) W15(0,-125.98) W16(31.5,-125.98) W17(62.99,-125.98) W18(94.49,-125.98) W19(125.98,-125.98) W20(157.48,-125.98) W21(188.98,-125.98) W22(220.47,-125.98) W23(251.97,-125.98) W24(283.46,-125.98) W25(314.96,-125.98) W26(346.46,-125.98) W27(377.95,-125.98) W28(409.45,-125.98) W29(440.94,-125.98) Y1(-440.94,-157.48) Y2(-409.45,-157.48) Y3(-377.95,-157.48) Y4(-346.46,-157.48) Y5(-314.96,-157.48) Y6(-283.46,-157.48) Y7(-251.97,-157.48) Y8(-220.47,-157.48) Y9(-188.98,-157.48) Y10(-157.48,-157.48) Y11(-125.98,-157.48) Y12(-94.49,-157.48) Y13(-62.99,-157.48) Y14(-31.5,-157.48) Y15(0,-157.48) Y16(31.5,-157.48) Y17(62.99,-157.48) Y18(94.49,-157.48) Y19(125.98,-157.48) Y20(157.48,-157.48) Y21(188.98,-157.48) Y22(220.47,-157.48) Y23(251.97,-157.48) Y24(283.46,-157.48) Y25(314.96,-157.48) Y26(346.46,-157.48) Y27(377.95,-157.48) Y28(409.45,-157.48) Y29(440.94,-157.48)